# Altium footprint library Connectors.PcbLib: 268 footprints (part 14 of 21)
Each footprint in its own frame and in the unit in brackets; x right, y up, seen from the top. Pads: shape width x height; smd on the part's side, far side on the other; paste and mask are expansions set on the pad; w line width, h text height; cw(c..) or ccw(c..) is an arc to the next point about the centre after c.
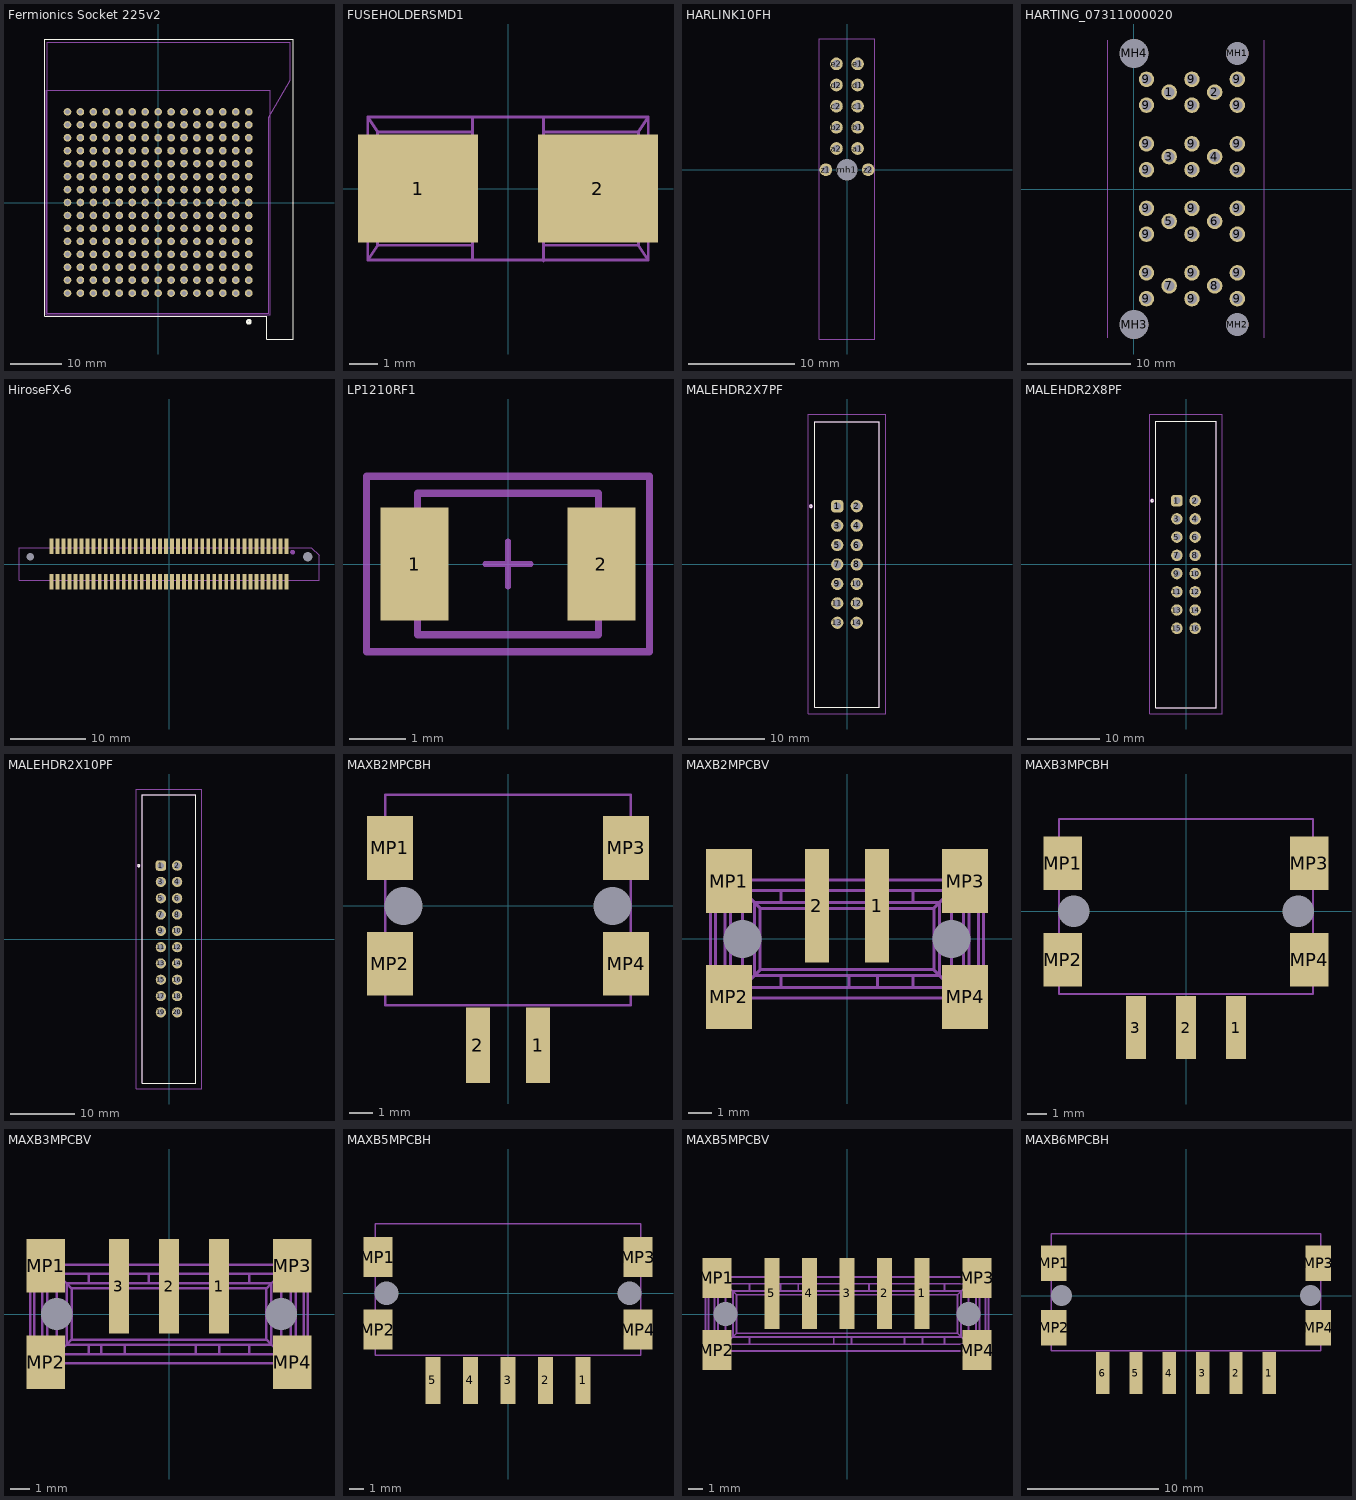
[diagram p13: the footprints below, top view; thin cyan lines are the x and y axes]

## Fermionics Socket 225v2 [mm] "Fermionics Socket 225 - Rotated Pinout to match Sensor"
height 8.636
pads (225):
  round 1.5 hole 0.9: A1(17.78,-17.78) A2(17.78,-15.24) A3(17.78,-12.7) A4(17.78,-10.16) A5(17.78,-7.62) A6(17.78,-5.08) A7(17.78,-2.54) A8(17.78,0) A9(17.78,2.54) A10(17.78,5.08) A11(17.78,7.62) A12(17.78,10.16) A13(17.78,12.7) A14(17.78,15.24) A15(17.78,17.78) B1(15.24,-17.78) B2(15.24,-15.24) B3(15.24,-12.7) B4(15.24,-10.16) B5(15.24,-7.62) B6(15.24,-5.08) B7(15.24,-2.54) B8(15.24,0) B9(15.24,2.54) B10(15.24,5.08) B11(15.24,7.62) B12(15.24,10.16) B13(15.24,12.7) B14(15.24,15.24) B15(15.24,17.78) C1(12.7,-17.78) C2(12.7,-15.24) C3(12.7,-12.7) C4(12.7,-10.16) C5(12.7,-7.62) C6(12.7,-5.08) C7(12.7,-2.54) C8(12.7,0) C9(12.7,2.54) C10(12.7,5.08) C11(12.7,7.62) C12(12.7,10.16) C13(12.7,12.7) C14(12.7,15.24) C15(12.7,17.78) D1(10.16,-17.78) D2(10.16,-15.24) D3(10.16,-12.7) D4(10.16,-10.16) D5(10.16,-7.62) D6(10.16,-5.08) D7(10.16,-2.54) D8(10.16,0) D9(10.16,2.54) D10(10.16,5.08) D11(10.16,7.62) D12(10.16,10.16) D13(10.16,12.7) D14(10.16,15.24) D15(10.16,17.78) E1(7.62,-17.78) E2(7.62,-15.24) E3(7.62,-12.7) E4(7.62,-10.16) E5(7.62,-7.62) E6(7.62,-5.08) E7(7.62,-2.54) E8(7.62,0) E9(7.62,2.54) E10(7.62,5.08) E11(7.62,7.62) E12(7.62,10.16) E13(7.62,12.7) E14(7.62,15.24) E15(7.62,17.78) F1(5.08,-17.78) F2(5.08,-15.24) F3(5.08,-12.7) F4(5.08,-10.16) F5(5.08,-7.62) F6(5.08,-5.08) F7(5.08,-2.54) F8(5.08,0) F9(5.08,2.54) F10(5.08,5.08) F11(5.08,7.62) F12(5.08,10.16) F13(5.08,12.7) F14(5.08,15.24) F15(5.08,17.78) G1(2.54,-17.78) G2(2.54,-15.24) G3(2.54,-12.7) G4(2.54,-10.16) G5(2.54,-7.62) G6(2.54,-5.08) G7(2.54,-2.54) G8(2.54,0) G9(2.54,2.54) G10(2.54,5.08) G11(2.54,7.62) G12(2.54,10.16) G13(2.54,12.7) G14(2.54,15.24) G15(2.54,17.78) H1(0,-17.78) H2(0,-15.24) H3(0,-12.7) H4(0,-10.16) H5(0,-7.62) H6(0,-5.08) H7(0,-2.54) H8(0,0) H9(0,2.54) H10(0,5.08) H11(0,7.62) H12(0,10.16) H13(0,12.7) H14(0,15.24) H15(0,17.78) J1(-2.54,-17.78) J2(-2.54,-15.24) J3(-2.54,-12.7) J4(-2.54,-10.16) J5(-2.54,-7.62) J6(-2.54,-5.08) J7(-2.54,-2.54) J8(-2.54,0) J9(-2.54,2.54) J10(-2.54,5.08) J11(-2.54,7.62) J12(-2.54,10.16) J13(-2.54,12.7) J14(-2.54,15.24) J15(-2.54,17.78) K1(-5.08,-17.78) K2(-5.08,-15.24) K3(-5.08,-12.7) K4(-5.08,-10.16) K5(-5.08,-7.62) K6(-5.08,-5.08) K7(-5.08,-2.54) K8(-5.08,0) K9(-5.08,2.54) K10(-5.08,5.08) K11(-5.08,7.62) K12(-5.08,10.16) K13(-5.08,12.7) K14(-5.08,15.24) K15(-5.08,17.78) L1(-7.62,-17.78) L2(-7.62,-15.24) L3(-7.62,-12.7) L4(-7.62,-10.16) L5(-7.62,-7.62) L6(-7.62,-5.08) L7(-7.62,-2.54) L8(-7.62,0) L9(-7.62,2.54) L10(-7.62,5.08) L11(-7.62,7.62) L12(-7.62,10.16) L13(-7.62,12.7) L14(-7.62,15.24) L15(-7.62,17.78) M1(-10.16,-17.78) M2(-10.16,-15.24) M3(-10.16,-12.7) M4(-10.16,-10.16) M5(-10.16,-7.62) M6(-10.16,-5.08) M7(-10.16,-2.54) M8(-10.16,0) M9(-10.16,2.54) M10(-10.16,5.08) M11(-10.16,7.62) M12(-10.16,10.16) M13(-10.16,12.7) M14(-10.16,15.24) M15(-10.16,17.78) N1(-12.7,-17.78) N2(-12.7,-15.24) N3(-12.7,-12.7) N4(-12.7,-10.16) N5(-12.7,-7.62) N6(-12.7,-5.08) N7(-12.7,-2.54) N8(-12.7,0) N9(-12.7,2.54) N10(-12.7,5.08) N11(-12.7,7.62) N12(-12.7,10.16) N13(-12.7,12.7) N14(-12.7,15.24) N15(-12.7,17.78) P1(-15.24,-17.78) P2(-15.24,-15.24) P3(-15.24,-12.7) P4(-15.24,-10.16) P5(-15.24,-7.62) P6(-15.24,-5.08) P7(-15.24,-2.54) P8(-15.24,0) P9(-15.24,2.54) P10(-15.24,5.08) P11(-15.24,7.62) P12(-15.24,10.16) P13(-15.24,12.7) P14(-15.24,15.24) P15(-15.24,17.78) R1(-17.78,-17.78) R2(-17.78,-15.24) R3(-17.78,-12.7) R4(-17.78,-10.16) R5(-17.78,-7.62) R6(-17.78,-5.08) R7(-17.78,-2.54) R8(-17.78,0) R9(-17.78,2.54) R10(-17.78,5.08) R11(-17.78,7.62) R12(-17.78,10.16) R13(-17.78,12.7) R14(-17.78,15.24) R15(-17.78,17.78)
Top Overlay:
  circle w0.5: c17.8,-23.4 r0.3
  lines w0.2: -22.275,-22.3 21.35,-22.3 21.35,-26.775 26.55,-26.775 26.55,32.075 -22.275,32.075 -22.275,-22.3
Mechanical 13:
  lines w0.1: -21.715,-21.715 21.715,-21.715 21.715,16.755 25.912,23.995 25.912,31.485 -21.715,31.485 -21.715,-21.715
Mechanical 15:
  lines w0.05: -21.975,-21.975 21.975,-21.975 21.975,21.975 -21.975,21.975 -21.975,-21.975
3D body: height 0, standoff -3.23, extent 17.485,-18.075 18.06,-17.5
3D body: height 0, standoff -3.23, extent 17.485,-15.535 18.06,-14.96
3D body: height 0, standoff -3.23, extent 17.485,-12.995 18.06,-12.42
3D body: height 0, standoff -3.23, extent 17.485,-10.455 18.06,-9.88
3D body: height 0, standoff -3.23, extent 17.485,-7.915 18.06,-7.34
3D body: height 0, standoff -3.23, extent 17.485,-5.375 18.06,-4.8
3D body: height 0, standoff -3.23, extent 17.485,-2.835 18.06,-2.26
3D body: height 0, standoff -3.23, extent 17.485,-0.295 18.06,0.28
3D body: height 0, standoff -3.23, extent 17.485,2.245 18.06,2.82
3D body: height 0, standoff -3.23, extent 17.485,4.785 18.06,5.36
3D body: height 0, standoff -3.23, extent 17.485,7.325 18.06,7.9
3D body: height 0, standoff -3.23, extent 17.485,9.865 18.06,10.44
3D body: height 0, standoff -3.23, extent 17.485,12.405 18.06,12.98
3D body: height 0, standoff -3.23, extent 17.485,14.945 18.06,15.52
3D body: height 0, standoff -3.23, extent 17.485,17.485 18.06,18.06
3D body: height 0, standoff -3.23, extent 14.945,-18.075 15.52,-17.5
3D body: height 0, standoff -3.23, extent 14.945,-15.535 15.52,-14.96
3D body: height 0, standoff -3.23, extent 14.945,-12.995 15.52,-12.42
3D body: height 0, standoff -3.23, extent 14.945,-10.455 15.52,-9.88
3D body: height 0, standoff -3.23, extent 14.945,-7.915 15.52,-7.34
3D body: height 0, standoff -3.23, extent 14.945,-5.375 15.52,-4.8
3D body: height 0, standoff -3.23, extent 14.945,-2.835 15.52,-2.26
3D body: height 0, standoff -3.23, extent 14.945,-0.295 15.52,0.28
3D body: height 0, standoff -3.23, extent 14.945,2.245 15.52,2.82
3D body: height 0, standoff -3.23, extent 14.945,4.785 15.52,5.36
3D body: height 0, standoff -3.23, extent 14.945,7.325 15.52,7.9
3D body: height 0, standoff -3.23, extent 14.945,9.865 15.52,10.44
3D body: height 0, standoff -3.23, extent 14.945,12.405 15.52,12.98
3D body: height 0, standoff -3.23, extent 14.945,14.945 15.52,15.52
3D body: height 0, standoff -3.23, extent 14.945,17.485 15.52,18.06
3D body: height 0, standoff -3.23, extent 12.405,-18.075 12.98,-17.5
3D body: height 0, standoff -3.23, extent 12.405,-15.535 12.98,-14.96
3D body: height 0, standoff -3.23, extent 12.405,-12.995 12.98,-12.42
3D body: height 0, standoff -3.23, extent 12.405,-10.455 12.98,-9.88
3D body: height 0, standoff -3.23, extent 12.405,-7.915 12.98,-7.34
3D body: height 0, standoff -3.23, extent 12.405,-5.375 12.98,-4.8
3D body: height 0, standoff -3.23, extent 12.405,-2.835 12.98,-2.26
3D body: height 0, standoff -3.23, extent 12.405,-0.295 12.98,0.28
3D body: height 0, standoff -3.23, extent 12.405,2.245 12.98,2.82
3D body: height 0, standoff -3.23, extent 12.405,4.785 12.98,5.36
3D body: height 0, standoff -3.23, extent 12.405,7.325 12.98,7.9
3D body: height 0, standoff -3.23, extent 12.405,9.865 12.98,10.44
3D body: height 0, standoff -3.23, extent 12.405,12.405 12.98,12.98
3D body: height 0, standoff -3.23, extent 12.405,14.945 12.98,15.52
3D body: height 0, standoff -3.23, extent 12.405,17.485 12.98,18.06
3D body: height 0, standoff -3.23, extent 9.865,-18.075 10.44,-17.5
3D body: height 0, standoff -3.23, extent 9.865,-15.535 10.44,-14.96
3D body: height 0, standoff -3.23, extent 9.865,-12.995 10.44,-12.42
3D body: height 0, standoff -3.23, extent 9.865,-10.455 10.44,-9.88
3D body: height 0, standoff -3.23, extent 9.865,-7.915 10.44,-7.34
3D body: height 0, standoff -3.23, extent 9.865,-5.375 10.44,-4.8
3D body: height 0, standoff -3.23, extent 9.865,-2.835 10.44,-2.26
3D body: height 0, standoff -3.23, extent 9.865,-0.295 10.44,0.28
3D body: height 0, standoff -3.23, extent 9.865,2.245 10.44,2.82
3D body: height 0, standoff -3.23, extent 9.865,4.785 10.44,5.36
3D body: height 0, standoff -3.23, extent 9.865,7.325 10.44,7.9
3D body: height 0, standoff -3.23, extent 9.865,9.865 10.44,10.44
3D body: height 0, standoff -3.23, extent 9.865,12.405 10.44,12.98
3D body: height 0, standoff -3.23, extent 9.865,14.945 10.44,15.52
3D body: height 0, standoff -3.23, extent 9.865,17.485 10.44,18.06
3D body: height 0, standoff -3.23, extent 7.325,-18.075 7.9,-17.5
3D body: height 0, standoff -3.23, extent 7.325,-15.535 7.9,-14.96
3D body: height 0, standoff -3.23, extent 7.325,-12.995 7.9,-12.42
3D body: height 0, standoff -3.23, extent 7.325,-10.455 7.9,-9.88
3D body: height 0, standoff -3.23, extent 7.325,-7.915 7.9,-7.34
3D body: height 0, standoff -3.23, extent 7.325,-5.375 7.9,-4.8
3D body: height 0, standoff -3.23, extent 7.325,-2.835 7.9,-2.26
3D body: height 0, standoff -3.23, extent 7.325,-0.295 7.9,0.28
3D body: height 0, standoff -3.23, extent 7.325,2.245 7.9,2.82
3D body: height 0, standoff -3.23, extent 7.325,4.785 7.9,5.36
3D body: height 0, standoff -3.23, extent 7.325,7.325 7.9,7.9
3D body: height 0, standoff -3.23, extent 7.325,9.865 7.9,10.44
3D body: height 0, standoff -3.23, extent 7.325,12.405 7.9,12.98
3D body: height 0, standoff -3.23, extent 7.325,14.945 7.9,15.52
3D body: height 0, standoff -3.23, extent 7.325,17.485 7.9,18.06
3D body: height 0, standoff -3.23, extent 4.785,-18.075 5.36,-17.5
3D body: height 0, standoff -3.23, extent 4.785,-15.535 5.36,-14.96
3D body: height 0, standoff -3.23, extent 4.785,-12.995 5.36,-12.42
3D body: height 0, standoff -3.23, extent 4.785,-10.455 5.36,-9.88
3D body: height 0, standoff -3.23, extent 4.785,-7.915 5.36,-7.34
3D body: height 0, standoff -3.23, extent 4.785,-5.375 5.36,-4.8
3D body: height 0, standoff -3.23, extent 4.785,-2.835 5.36,-2.26
3D body: height 0, standoff -3.23, extent 4.785,-0.295 5.36,0.28
3D body: height 0, standoff -3.23, extent 4.785,2.245 5.36,2.82
3D body: height 0, standoff -3.23, extent 4.785,4.785 5.36,5.36
3D body: height 0, standoff -3.23, extent 4.785,7.325 5.36,7.9
3D body: height 0, standoff -3.23, extent 4.785,9.865 5.36,10.44
3D body: height 0, standoff -3.23, extent 4.785,12.405 5.36,12.98
3D body: height 0, standoff -3.23, extent 4.785,14.945 5.36,15.52
3D body: height 0, standoff -3.23, extent 4.785,17.485 5.36,18.06
3D body: height 0, standoff -3.23, extent 2.245,-18.075 2.82,-17.5
3D body: height 0, standoff -3.23, extent 2.245,-15.535 2.82,-14.96
3D body: height 0, standoff -3.23, extent 2.245,-12.995 2.82,-12.42
3D body: height 0, standoff -3.23, extent 2.245,-10.455 2.82,-9.88
3D body: height 0, standoff -3.23, extent 2.245,-7.915 2.82,-7.34
3D body: height 0, standoff -3.23, extent 2.245,-5.375 2.82,-4.8
3D body: height 0, standoff -3.23, extent 2.245,-2.835 2.82,-2.26
3D body: height 0, standoff -3.23, extent 2.245,-0.295 2.82,0.28
3D body: height 0, standoff -3.23, extent 2.245,2.245 2.82,2.82
3D body: height 0, standoff -3.23, extent 2.245,4.785 2.82,5.36
3D body: height 0, standoff -3.23, extent 2.245,7.325 2.82,7.9
3D body: height 0, standoff -3.23, extent 2.245,9.865 2.82,10.44
3D body: height 0, standoff -3.23, extent 2.245,12.405 2.82,12.98
3D body: height 0, standoff -3.23, extent 2.245,14.945 2.82,15.52
3D body: height 0, standoff -3.23, extent 2.245,17.485 2.82,18.06
3D body: height 0, standoff -3.23, extent -0.295,-18.075 0.28,-17.5
3D body: height 0, standoff -3.23, extent -0.295,-15.535 0.28,-14.96
3D body: height 0, standoff -3.23, extent -0.295,-12.995 0.28,-12.42
3D body: height 0, standoff -3.23, extent -0.295,-10.455 0.28,-9.88
3D body: height 0, standoff -3.23, extent -0.295,-7.915 0.28,-7.34
3D body: height 0, standoff -3.23, extent -0.295,-5.375 0.28,-4.8
3D body: height 0, standoff -3.23, extent -0.295,-2.835 0.28,-2.26
3D body: height 0, standoff -3.23, extent -0.295,-0.295 0.28,0.28
3D body: height 0, standoff -3.23, extent -0.295,2.245 0.28,2.82
3D body: height 0, standoff -3.23, extent -0.295,4.785 0.28,5.36
3D body: height 0, standoff -3.23, extent -0.295,7.325 0.28,7.9
3D body: height 0, standoff -3.23, extent -0.295,9.865 0.28,10.44
3D body: height 0, standoff -3.23, extent -0.295,12.405 0.28,12.98
3D body: height 0, standoff -3.23, extent -0.295,14.945 0.28,15.52
3D body: height 0, standoff -3.23, extent -0.295,17.485 0.28,18.06
3D body: height 0, standoff -3.23, extent -2.835,-18.075 -2.26,-17.5
3D body: height 0, standoff -3.23, extent -2.835,-15.535 -2.26,-14.96
3D body: height 0, standoff -3.23, extent -2.835,-12.995 -2.26,-12.42
3D body: height 0, standoff -3.23, extent -2.835,-10.455 -2.26,-9.88
3D body: height 0, standoff -3.23, extent -2.835,-7.915 -2.26,-7.34
3D body: height 0, standoff -3.23, extent -2.835,-5.375 -2.26,-4.8
3D body: height 0, standoff -3.23, extent -2.835,-2.835 -2.26,-2.26
3D body: height 0, standoff -3.23, extent -2.835,-0.295 -2.26,0.28
3D body: height 0, standoff -3.23, extent -2.835,2.245 -2.26,2.82
3D body: height 0, standoff -3.23, extent -2.835,4.785 -2.26,5.36
3D body: height 0, standoff -3.23, extent -2.835,7.325 -2.26,7.9
3D body: height 0, standoff -3.23, extent -2.835,9.865 -2.26,10.44
3D body: height 0, standoff -3.23, extent -2.835,12.405 -2.26,12.98
3D body: height 0, standoff -3.23, extent -2.835,14.945 -2.26,15.52
3D body: height 0, standoff -3.23, extent -2.835,17.485 -2.26,18.06
3D body: height 0, standoff -3.23, extent -5.375,-18.075 -4.8,-17.5
3D body: height 0, standoff -3.23, extent -5.375,-15.535 -4.8,-14.96
3D body: height 0, standoff -3.23, extent -5.375,-12.995 -4.8,-12.42
3D body: height 0, standoff -3.23, extent -5.375,-10.455 -4.8,-9.88
3D body: height 0, standoff -3.23, extent -5.375,-7.915 -4.8,-7.34
3D body: height 0, standoff -3.23, extent -5.375,-5.375 -4.8,-4.8
3D body: height 0, standoff -3.23, extent -5.375,-2.835 -4.8,-2.26
3D body: height 0, standoff -3.23, extent -5.375,-0.295 -4.8,0.28
3D body: height 0, standoff -3.23, extent -5.375,2.245 -4.8,2.82
3D body: height 0, standoff -3.23, extent -5.375,4.785 -4.8,5.36
3D body: height 0, standoff -3.23, extent -5.375,7.325 -4.8,7.9
3D body: height 0, standoff -3.23, extent -5.375,9.865 -4.8,10.44
3D body: height 0, standoff -3.23, extent -5.375,12.405 -4.8,12.98
3D body: height 0, standoff -3.23, extent -5.375,14.945 -4.8,15.52
3D body: height 0, standoff -3.23, extent -5.375,17.485 -4.8,18.06
3D body: height 0, standoff -3.23, extent -7.915,-18.075 -7.34,-17.5
3D body: height 0, standoff -3.23, extent -7.915,-15.535 -7.34,-14.96
3D body: height 0, standoff -3.23, extent -7.915,-12.995 -7.34,-12.42
3D body: height 0, standoff -3.23, extent -7.915,-10.455 -7.34,-9.88
3D body: height 0, standoff -3.23, extent -7.915,-7.915 -7.34,-7.34
3D body: height 0, standoff -3.23, extent -7.915,-5.375 -7.34,-4.8
3D body: height 0, standoff -3.23, extent -7.915,-2.835 -7.34,-2.26
3D body: height 0, standoff -3.23, extent -7.915,-0.295 -7.34,0.28
3D body: height 0, standoff -3.23, extent -7.915,2.245 -7.34,2.82
3D body: height 0, standoff -3.23, extent -7.915,4.785 -7.34,5.36
3D body: height 0, standoff -3.23, extent -7.915,7.325 -7.34,7.9
3D body: height 0, standoff -3.23, extent -7.915,9.865 -7.34,10.44
3D body: height 0, standoff -3.23, extent -7.915,12.405 -7.34,12.98
3D body: height 0, standoff -3.23, extent -7.915,14.945 -7.34,15.52
3D body: height 0, standoff -3.23, extent -7.915,17.485 -7.34,18.06
3D body: height 0, standoff -3.23, extent -10.455,-18.075 -9.88,-17.5
3D body: height 0, standoff -3.23, extent -10.455,-15.535 -9.88,-14.96
3D body: height 0, standoff -3.23, extent -10.455,-12.995 -9.88,-12.42
3D body: height 0, standoff -3.23, extent -10.455,-10.455 -9.88,-9.88
3D body: height 0, standoff -3.23, extent -10.455,-7.915 -9.88,-7.34
3D body: height 0, standoff -3.23, extent -10.455,-5.375 -9.88,-4.8
3D body: height 0, standoff -3.23, extent -10.455,-2.835 -9.88,-2.26
3D body: height 0, standoff -3.23, extent -10.455,-0.295 -9.88,0.28
3D body: height 0, standoff -3.23, extent -10.455,2.245 -9.88,2.82
3D body: height 0, standoff -3.23, extent -10.455,4.785 -9.88,5.36
3D body: height 0, standoff -3.23, extent -10.455,7.325 -9.88,7.9
3D body: height 0, standoff -3.23, extent -10.455,9.865 -9.88,10.44
3D body: height 0, standoff -3.23, extent -10.455,12.405 -9.88,12.98
3D body: height 0, standoff -3.23, extent -10.455,14.945 -9.88,15.52
3D body: height 0, standoff -3.23, extent -10.455,17.485 -9.88,18.06
3D body: height 0, standoff -3.23, extent -12.995,-18.075 -12.42,-17.5
3D body: height 0, standoff -3.23, extent -12.995,-15.535 -12.42,-14.96
3D body: height 0, standoff -3.23, extent -12.995,-12.995 -12.42,-12.42
3D body: height 0, standoff -3.23, extent -12.995,-10.455 -12.42,-9.88
3D body: height 0, standoff -3.23, extent -12.995,-7.915 -12.42,-7.34
3D body: height 0, standoff -3.23, extent -12.995,-5.375 -12.42,-4.8
3D body: height 0, standoff -3.23, extent -12.995,-2.835 -12.42,-2.26
3D body: height 0, standoff -3.23, extent -12.995,-0.295 -12.42,0.28
3D body: height 0, standoff -3.23, extent -12.995,2.245 -12.42,2.82
3D body: height 0, standoff -3.23, extent -12.995,4.785 -12.42,5.36
3D body: height 0, standoff -3.23, extent -12.995,7.325 -12.42,7.9
3D body: height 0, standoff -3.23, extent -12.995,9.865 -12.42,10.44
3D body: height 0, standoff -3.23, extent -12.995,12.405 -12.42,12.98
3D body: height 0, standoff -3.23, extent -12.995,14.945 -12.42,15.52
3D body: height 0, standoff -3.23, extent -12.995,17.485 -12.42,18.06
3D body: height 0, standoff -3.23, extent -15.535,-18.075 -14.96,-17.5
3D body: height 0, standoff -3.23, extent -15.535,-15.535 -14.96,-14.96
3D body: height 0, standoff -3.23, extent -15.535,-12.995 -14.96,-12.42
3D body: height 0, standoff -3.23, extent -15.535,-10.455 -14.96,-9.88
3D body: height 0, standoff -3.23, extent -15.535,-7.915 -14.96,-7.34
3D body: height 0, standoff -3.23, extent -15.535,-5.375 -14.96,-4.8
3D body: height 0, standoff -3.23, extent -15.535,-2.835 -14.96,-2.26
3D body: height 0, standoff -3.23, extent -15.535,-0.295 -14.96,0.28
3D body: height 0, standoff -3.23, extent -15.535,2.245 -14.96,2.82
3D body: height 0, standoff -3.23, extent -15.535,4.785 -14.96,5.36
3D body: height 0, standoff -3.23, extent -15.535,7.325 -14.96,7.9
3D body: height 0, standoff -3.23, extent -15.535,9.865 -14.96,10.44
3D body: height 0, standoff -3.23, extent -15.535,12.405 -14.96,12.98
3D body: height 0, standoff -3.23, extent -15.535,14.945 -14.96,15.52
3D body: height 0, standoff -3.23, extent -15.535,17.485 -14.96,18.06
3D body: height 0, standoff -3.23, extent -18.075,17.485 -17.5,18.06
3D body: height 0, standoff -3.23, extent -18.075,14.945 -17.5,15.52
3D body: height 0, standoff -3.23, extent -18.075,12.405 -17.5,12.98
3D body: height 0, standoff -3.23, extent -18.075,9.865 -17.5,10.44
3D body: height 0, standoff -3.23, extent -18.075,7.325 -17.5,7.9
3D body: height 0, standoff -3.23, extent -18.075,4.785 -17.5,5.36
3D body: height 0, standoff -3.23, extent -18.075,2.245 -17.5,2.82
3D body: height 0, standoff -3.23, extent -18.075,-0.295 -17.5,0.28
3D body: height 0, standoff -3.23, extent -18.075,-2.835 -17.5,-2.26
3D body: height 0, standoff -3.23, extent -18.075,-5.375 -17.5,-4.8
3D body: height 0, standoff -3.23, extent -18.075,-7.915 -17.5,-7.34
3D body: height 0, standoff -3.23, extent -18.075,-10.455 -17.5,-9.88
3D body: height 0, standoff -3.23, extent -18.075,-12.995 -17.5,-12.42
3D body: height 0, standoff -3.23, extent -18.075,-15.535 -17.5,-14.96
3D body: height 0, standoff -3.23, extent -18.075,-18.075 -17.5,-17.5
3D body: height 8.64, standoff 0, extent -21.715,-21.715 25.912,31.485
3D body: height 8.64, standoff 4, extent 21.975,-26.795 25.726,23.675

## FUSEHOLDERSMD1 [mm]
pads (2):
  rect 4.24x3.81 smd: 1(-3.175,0) 2(3.175,0)
Mechanical 13:
  lines w0.102: -1.25,-2.525 -1.25,-1.325 -3.5,-1.325 -3.5,1.325 -1.25,1.325 -1.25,2.525 ; -1.25,-2 -4.6,-2 ; -1.25,2 -4.6,2 ; 1.25,-2.55 1.25,-1.35 3.5,-1.35 3.5,1.3 1.25,1.3 1.25,2.5 ; 1.25,-2 4.6,-2 ; 1.25,2 4.6,2 ; -4.95,-2.525 -4.95,2.525 ; -4.95,-2.525 4.95,-2.525 ; -4.95,-2.525 -4.6,-2 ; -4.95,2.525 4.95,2.525 ; -4.95,2.525 -4.6,2 ; -4.6,-2 -4.6,2 ; 4.6,-2 4.6,2 ; 4.6,-2 4.95,-2.525 ; 4.6,2 4.95,2.525 ; 4.95,-2.525 4.95,2.525

## HARLINK10FH [mm] "HarLink 10pin female hor."
height 11.5
pads (13):
  round 1.2 hole 0.7: a1(1,2) a2(-1,2) b1(1,4) b2(-1,4) c1(1,6) c2(-1,6) d1(1,8) d2(-1,8) e1(1,10) e2(-1,10) z1(-2,0) z2(2,0)
  round 1.9 hole 2 unplated mask+0.2: mh1(0,0)
Mechanical 13:
  lines w0.1: -2.6,-16 -2.6,12.35 2.6,12.35 2.6,-16 -2.6,-16
3D body "27_har-link_female_angled_PCB.stp": height 11.75, standoff -3, extent -2.899,-16 2.899,12.35

## HARTING_07311000020 [mm] "Coax conn 8ch Harting 0731 100 0020"
height 7.925
pads (36):
  round 1.5 hole 1: 1(3.45,9.375) 2(7.85,9.375) 3(3.45,3.125) 4(7.85,3.125) 5(3.45,-3.125) 6(7.85,-3.125) 7(3.45,-9.375) 8(7.85,-9.375) 9(1.25,-10.625) 9(1.25,-8.125) 9(1.25,-4.375) 9(1.25,-1.875) 9(1.25,1.875) 9(1.25,4.375) 9(1.25,8.125) 9(1.25,10.625) 9(5.65,-10.625) 9(5.65,-8.125) 9(5.65,-4.375) 9(5.65,-1.875) 9(5.65,1.875) 9(5.65,4.375) 9(5.65,8.125) 9(5.65,10.625) 9(10.05,-10.625) 9(10.05,-8.125) 9(10.05,-4.375) 9(10.05,-1.875) 9(10.05,1.875) 9(10.05,4.375) 9(10.05,8.125) 9(10.05,10.625)
  round 2.15 hole 2.2 unplated: MH1(10.05,13.125) MH2(10.05,-13.125)
  round 2.75 hole 2.8 unplated: MH3(0.05,-13.125) MH4(0.05,13.125)
Mechanical 15:
  lines w0.1: -2.5,-14.4 -2.5,14.4 ; 12.65,-14.4 12.65,14.4
  text "NO COMPONENTS HERE" at 12.35,8.8 h1
3D body "0731_Mini_Coax_angled_8-pak.stp": height 9, standoff -4, extent -14.85,-14.55 11.7,14.6

## HiroseFX-6 [mm] "0.8mm Pitch Stacking Height 9mm Header-Stacking Connector"
height 7
pads (82):
  rect 0.5x2 smd: 1(15.6,2.35) 2(15.6,-2.35) 3(14.8,2.35) 4(14.8,-2.35) 5(14,2.35) 6(14,-2.35) 7(13.2,2.35) 8(13.2,-2.35) 9(12.4,2.35) 10(12.4,-2.35) 11(11.6,2.35) 12(11.6,-2.35) 13(10.8,2.35) 14(10.8,-2.35) 15(10,2.35) 16(10,-2.35) 17(9.2,2.35) 18(9.2,-2.35) 19(8.4,2.35) 20(8.4,-2.35) 21(7.6,2.35) 22(7.6,-2.35) 23(6.8,2.35) 24(6.8,-2.35) 25(6,2.35) 26(6,-2.35) 27(5.2,2.35) 28(5.2,-2.35) 29(4.4,2.35) 30(4.4,-2.35) 31(3.6,2.35) 32(3.6,-2.35) 33(2.8,2.35) 34(2.8,-2.35) 35(2,2.35) 36(2,-2.35) 37(1.2,2.35) 38(1.2,-2.35) 39(0.4,2.35) 40(0.4,-2.35) 41(-0.4,2.35) 42(-0.4,-2.35) 43(-1.2,2.35) 44(-1.2,-2.35) 45(-2,2.35) 46(-2,-2.35) 47(-2.8,2.35) 48(-2.8,-2.35) 49(-3.6,2.35) 50(-3.6,-2.35) 51(-4.4,2.35) 52(-4.4,-2.35) 53(-5.2,2.35) 54(-5.2,-2.35) 55(-6,2.35) 56(-6,-2.35) 57(-6.8,2.35) 58(-6.8,-2.35) 59(-7.6,2.35) 60(-7.6,-2.35) 61(-8.4,2.35) 62(-8.4,-2.35) 63(-9.2,2.35) 64(-9.2,-2.35) 65(-10,2.35) 66(-10,-2.35) 67(-10.8,2.35) 68(-10.8,-2.35) 69(-11.6,2.35) 70(-11.6,-2.35) 71(-12.4,2.35) 72(-12.4,-2.35) 73(-13.2,2.35) 74(-13.2,-2.35) 75(-14,2.35) 76(-14,-2.35) 77(-14.8,2.35) 78(-14.8,-2.35) 79(-15.6,2.35) 80(-15.6,-2.35)
  round 0 hole 1.3 unplated: MH1(18.4,0.95)
  round 0 hole 1 unplated: MH2(-18.4,0.95)
Mechanical 13:
  circle w0.381: c16.4,1.575 r0.125
  lines w0.127: -19.9,-2.15 -19.9,2.15 18.9,2.15 19.9,1.15 19.9,-2.15 -19.9,-2.15
3D body: height 0, standoff -0.8, extent -18.85,0.5 -17.95,1.4
3D body: height 0, standoff -0.8, extent 17.8,0.35 19,1.55
3D body: height 4, standoff 0, extent -19.9,-2.15 19.9,2.15
3D body: height 4.01, standoff 4, extent 16.1,1.275 16.7,1.875

## LP1210RF1 [mm] "Chip capacitor 1210 (3225)"
height 2
pads (2):
  rect 1.2x2 smd: 1(-1.65,0) 2(1.65,0)
Mechanical 13:
  lines w0.127: -1.6,-1.25 1.6,-1.25 1.6,1.25 -1.6,1.25 -1.6,-1.25
Mechanical 15:
  lines w0.102: -0.4,0 0.4,0 ; 0,-0.4 0,0.4
  lines w0.127: -2.5,-1.55 -2.5,1.55 2.5,1.55 2.5,-1.55 -2.5,-1.55
3D body: height 2, standoff 0, extent -1.6,-1.25 1.6,1.25

## MALEHDR2X7PF [mm] "Male header 2x7 pin R2.54mm press fit"
height 24.7
pads (14):
  rrect50% 1.6x1.6 hole 1 paste-1.27: 1(-1.27,7.62)
  round 1.6 hole 1 paste-1.27: 2(1.27,7.62) 3(-1.27,5.08) 4(1.27,5.08) 5(-1.27,2.54) 6(1.27,2.54) 7(-1.27,0) 8(1.27,0) 9(-1.27,-2.54) 10(1.27,-2.54) 11(-1.27,-5.08) 12(1.27,-5.08) 13(-1.27,-7.62) 14(1.27,-7.62)
Top Overlay:
  circle w0.15: c-4.724,7.62 r0.152
  lines w0.127: -4.191,-18.669 -4.191,18.669 4.191,18.669 4.191,-18.669 -4.191,-18.669
Mechanical 13:
  circle w0.254: c-4.724,7.62 r0.152
  lines w0.102: -4.2,-18.66 4.2,-18.66 4.2,18.66 -4.2,18.66 -4.2,-18.66
Mechanical 15:
  lines w0.127: -5.08,-19.558 5.08,-19.558 5.08,19.685 -5.08,19.685 -5.08,-19.558
3D body: height 6, standoff 0, extent -4.2,-18.66 4.2,18.66
3D body: height 24.7, standoff 13.2, extent -1.524,11.548 1.524,18.66
3D body: height 24.7, standoff 13.2, extent -1.524,-18.66 1.524,-11.548
3D body: height 13.2, standoff 6, extent 0,-18.66 4.2,18.66
3D body: height 13.2, standoff 6, extent -4.2,2.54 0,18.66
3D body: height 13.2, standoff 6, extent -4.2,-18.66 0,-2.565
3D body: height 13.2, standoff 6, extent -1.651,7.239 -0.889,8.001
3D body: height 13.2, standoff 6, extent -1.651,4.699 -0.889,5.461
3D body: height 13.2, standoff 6, extent -1.651,2.159 -0.889,2.921
3D body: height 13.2, standoff 6, extent -1.651,-0.381 -0.889,0.381
3D body: height 13.2, standoff 6, extent -1.651,-2.921 -0.889,-2.159
3D body: height 13.2, standoff 6, extent -1.651,-5.461 -0.889,-4.699
3D body: height 13.2, standoff 6, extent -1.651,-8.001 -0.889,-7.239
3D body: height 0, standoff -4.6, extent -1.524,7.112 -1.016,8.128
3D body: height 0, standoff -4.6, extent -1.524,4.572 -1.016,5.588
3D body: height 0, standoff -4.6, extent -1.524,2.032 -1.016,3.048
3D body: height 0, standoff -4.6, extent -1.524,-0.508 -1.016,0.508
3D body: height 0, standoff -4.6, extent -1.524,-3.048 -1.016,-2.032
3D body: height 0, standoff -4.6, extent -1.524,-5.588 -1.016,-4.572
3D body: height 0, standoff -4.6, extent -1.524,-8.128 -1.016,-7.112
3D body: height 0, standoff -4.6, extent 1.016,-8.128 1.524,-7.112
3D body: height 0, standoff -4.6, extent 1.016,-5.588 1.524,-4.572
3D body: height 0, standoff -4.6, extent 1.016,-3.048 1.524,-2.032
3D body: height 0, standoff -4.6, extent 1.016,-0.508 1.524,0.508
3D body: height 0, standoff -4.6, extent 1.016,2.032 1.524,3.048
3D body: height 0, standoff -4.6, extent 1.016,4.572 1.524,5.588
3D body: height 0, standoff -4.6, extent 1.016,7.112 1.524,8.128
3D body: height 13.2, standoff 6, extent 0.889,-8.001 1.651,-7.239
3D body: height 13.2, standoff 6, extent 0.889,-5.461 1.651,-4.699
3D body: height 13.2, standoff 6, extent 0.889,-2.921 1.651,-2.159
3D body: height 13.2, standoff 6, extent 0.889,-0.381 1.651,0.381
3D body: height 13.2, standoff 6, extent 0.889,2.159 1.651,2.921
3D body: height 13.2, standoff 6, extent 0.889,4.699 1.651,5.461
3D body: height 13.2, standoff 6, extent 0.889,7.239 1.651,8.001

## MALEHDR2X8PF [mm] "Male header 2x8 pin R2.54mm press fit"
height 24.7
pads (16):
  rrect50% 1.6x1.6 hole 1 paste-1.27: 1(-1.27,8.89)
  round 1.6 hole 1 paste-1.27: 2(1.27,8.89) 3(-1.27,6.35) 4(1.27,6.35) 5(-1.27,3.81) 6(1.27,3.81) 7(-1.27,1.27) 8(1.27,1.27) 9(-1.27,-1.27) 10(1.27,-1.27) 11(-1.27,-3.81) 12(1.27,-3.81) 13(-1.27,-6.35) 14(1.27,-6.35) 15(-1.27,-8.89) 16(1.27,-8.89)
Top Overlay:
  circle w0.15: c-4.724,8.89 r0.152
  lines w0.127: -4.191,-19.939 -4.191,19.939 4.191,19.939 4.191,-19.939 -4.191,-19.939
Mechanical 13:
  circle w0.254: c-4.724,8.89 r0.152
  lines w0.102: -4.2,-19.93 4.2,-19.93 4.2,19.93 -4.2,19.93 -4.2,-19.93
Mechanical 15:
  lines w0.127: -5.08,-20.828 5.08,-20.828 5.08,20.955 -5.08,20.955 -5.08,-20.828
3D body: height 6, standoff 0, extent -4.2,-19.93 4.2,19.93
3D body: height 24.7, standoff 13.2, extent -1.524,12.818 1.524,19.93
3D body: height 24.7, standoff 13.2, extent -1.524,-19.93 1.524,-12.818
3D body: height 13.2, standoff 6, extent 0,-19.93 4.2,19.93
3D body: height 13.2, standoff 6, extent -4.2,2.54 0,19.93
3D body: height 13.2, standoff 6, extent -4.2,-19.93 0,-2.54
3D body: height 13.2, standoff 6, extent -1.651,8.509 -0.889,9.271
3D body: height 13.2, standoff 6, extent -1.651,5.969 -0.889,6.731
3D body: height 13.2, standoff 6, extent -1.651,3.429 -0.889,4.191
3D body: height 13.2, standoff 6, extent -1.651,0.889 -0.889,1.651
3D body: height 13.2, standoff 6, extent -1.651,-1.651 -0.889,-0.889
3D body: height 13.2, standoff 6, extent -1.651,-4.191 -0.889,-3.429
3D body: height 13.2, standoff 6, extent -1.651,-6.731 -0.889,-5.969
3D body: height 13.2, standoff 6, extent -1.651,-9.271 -0.889,-8.509
3D body: height 0, standoff -4.6, extent -1.524,8.382 -1.016,9.398
3D body: height 0, standoff -4.6, extent -1.524,5.842 -1.016,6.858
3D body: height 0, standoff -4.6, extent -1.524,3.302 -1.016,4.318
3D body: height 0, standoff -4.6, extent -1.524,0.762 -1.016,1.778
3D body: height 0, standoff -4.6, extent -1.524,-1.778 -1.016,-0.762
3D body: height 0, standoff -4.6, extent -1.524,-4.318 -1.016,-3.302
3D body: height 0, standoff -4.6, extent -1.524,-6.858 -1.016,-5.842
3D body: height 0, standoff -4.6, extent -1.524,-9.398 -1.016,-8.382
3D body: height 0, standoff -4.6, extent 1.016,-9.398 1.524,-8.382
3D body: height 0, standoff -4.6, extent 1.016,-6.858 1.524,-5.842
3D body: height 0, standoff -4.6, extent 1.016,-4.318 1.524,-3.302
3D body: height 0, standoff -4.6, extent 1.016,-1.778 1.524,-0.762
3D body: height 0, standoff -4.6, extent 1.016,0.762 1.524,1.778
3D body: height 0, standoff -4.6, extent 1.016,3.302 1.524,4.318
3D body: height 0, standoff -4.6, extent 1.016,5.842 1.524,6.858
3D body: height 0, standoff -4.6, extent 1.016,8.382 1.524,9.398
3D body: height 13.2, standoff 6, extent 0.889,-9.271 1.651,-8.509
3D body: height 13.2, standoff 6, extent 0.889,-6.731 1.651,-5.969
3D body: height 13.2, standoff 6, extent 0.889,-4.191 1.651,-3.429
3D body: height 13.2, standoff 6, extent 0.889,-1.651 1.651,-0.889
3D body: height 13.2, standoff 6, extent 0.889,0.889 1.651,1.651
3D body: height 13.2, standoff 6, extent 0.889,3.429 1.651,4.191
3D body: height 13.2, standoff 6, extent 0.889,5.969 1.651,6.731
3D body: height 13.2, standoff 6, extent 0.889,8.509 1.651,9.271

## MALEHDR2X10PF [mm] "Male header 2x10 pin R2.54mm press fit"
height 24.7
pads (20):
  rrect50% 1.6x1.6 hole 1 paste-1.27: 1(-1.27,11.43)
  round 1.6 hole 1 paste-1.27: 2(1.27,11.43) 3(-1.27,8.89) 4(1.27,8.89) 5(-1.27,6.35) 6(1.27,6.35) 7(-1.27,3.81) 8(1.27,3.81) 9(-1.27,1.27) 10(1.27,1.27) 11(-1.27,-1.27) 12(1.27,-1.27) 13(-1.27,-3.81) 14(1.27,-3.81) 15(-1.27,-6.35) 16(1.27,-6.35) 17(-1.27,-8.89) 18(1.27,-8.89) 19(-1.27,-11.43) 20(1.27,-11.43)
Top Overlay:
  circle w0.15: c-4.724,11.43 r0.152
  lines w0.127: -4.191,-22.479 -4.191,22.479 4.191,22.479 4.191,-22.479 -4.191,-22.479
Mechanical 13:
  circle w0.254: c-4.724,11.43 r0.152
  lines w0.102: -4.2,-22.47 4.2,-22.47 4.2,22.47 -4.2,22.47 -4.2,-22.47
Mechanical 15:
  lines w0.127: -5.08,-23.368 5.08,-23.368 5.08,23.368 -5.08,23.368 -5.08,-23.368
3D body: height 6, standoff 0, extent -4.2,-22.47 4.2,22.47
3D body: height 24.7, standoff 13.2, extent -1.524,15.24 1.524,22.352
3D body: height 24.7, standoff 13.2, extent -1.524,-22.352 1.524,-15.24
3D body: height 13.2, standoff 6, extent 0,-22.47 4.2,22.47
3D body: height 13.2, standoff 6, extent -4.2,2.54 0,22.47
3D body: height 13.2, standoff 6, extent -4.2,-22.47 0,-2.54
3D body: height 13.2, standoff 6, extent -1.651,11.049 -0.889,11.811
3D body: height 13.2, standoff 6, extent -1.651,8.509 -0.889,9.271
3D body: height 13.2, standoff 6, extent -1.651,5.969 -0.889,6.731
3D body: height 13.2, standoff 6, extent -1.651,3.429 -0.889,4.191
3D body: height 13.2, standoff 6, extent -1.651,0.889 -0.889,1.651
3D body: height 13.2, standoff 6, extent -1.651,-1.651 -0.889,-0.889
3D body: height 13.2, standoff 6, extent -1.651,-4.191 -0.889,-3.429
3D body: height 13.2, standoff 6, extent -1.651,-6.731 -0.889,-5.969
3D body: height 13.2, standoff 6, extent -1.651,-9.271 -0.889,-8.509
3D body: height 13.2, standoff 6, extent -1.651,-11.811 -0.889,-11.049
3D body: height 0, standoff -4.6, extent -1.524,10.922 -1.016,11.938
3D body: height 0, standoff -4.6, extent -1.524,8.382 -1.016,9.398
3D body: height 0, standoff -4.6, extent -1.524,5.842 -1.016,6.858
3D body: height 0, standoff -4.6, extent -1.524,3.302 -1.016,4.318
3D body: height 0, standoff -4.6, extent -1.524,0.762 -1.016,1.778
3D body: height 0, standoff -4.6, extent -1.524,-1.778 -1.016,-0.762
3D body: height 0, standoff -4.6, extent -1.524,-4.318 -1.016,-3.302
3D body: height 0, standoff -4.6, extent -1.524,-6.858 -1.016,-5.842
3D body: height 0, standoff -4.6, extent -1.524,-9.398 -1.016,-8.382
3D body: height 0, standoff -4.6, extent -1.524,-11.938 -1.016,-10.922
3D body: height 0, standoff -4.6, extent 1.016,-11.938 1.524,-10.922
3D body: height 0, standoff -4.6, extent 1.016,-9.398 1.524,-8.382
3D body: height 0, standoff -4.6, extent 1.016,-6.858 1.524,-5.842
3D body: height 0, standoff -4.6, extent 1.016,-4.318 1.524,-3.302
3D body: height 0, standoff -4.6, extent 1.016,-1.778 1.524,-0.762
3D body: height 0, standoff -4.6, extent 1.016,0.762 1.524,1.778
3D body: height 0, standoff -4.6, extent 1.016,3.302 1.524,4.318
3D body: height 0, standoff -4.6, extent 1.016,5.842 1.524,6.858
3D body: height 0, standoff -4.6, extent 1.016,8.382 1.524,9.398
3D body: height 0, standoff -4.6, extent 1.016,10.922 1.524,11.938
3D body: height 13.2, standoff 6, extent 0.889,-11.811 1.651,-11.049
3D body: height 13.2, standoff 6, extent 0.889,-9.271 1.651,-8.509
3D body: height 13.2, standoff 6, extent 0.889,-6.731 1.651,-5.969
3D body: height 13.2, standoff 6, extent 0.889,-4.191 1.651,-3.429
3D body: height 13.2, standoff 6, extent 0.889,-1.651 1.651,-0.889
3D body: height 13.2, standoff 6, extent 0.889,0.889 1.651,1.651
3D body: height 13.2, standoff 6, extent 0.889,3.429 1.651,4.191
3D body: height 13.2, standoff 6, extent 0.889,5.969 1.651,6.731
3D body: height 13.2, standoff 6, extent 0.889,8.509 1.651,9.271
3D body: height 13.2, standoff 6, extent 0.889,11.049 1.651,11.811

## MAXB2MPCBH [mm] "MaxiBridge 2 pin MALE HORIZONTAL"
height 5.05
pads (8):
  rect 1.02x3.2 smd: 1(1.27,-5.9) 2(-1.27,-5.9)
  rect 0x0 hole 1.6 unplated: MH1(-4.42,0) MH2(4.42,0)
  rect 1.95x2.7 smd: MP1(-4.995,2.45) MP2(-4.995,-2.45) MP3(4.995,2.45) MP4(4.995,-2.45)
Mechanical 13:
  lines w0.102: -5.19,-4.2 -5.19,4.7 5.19,4.7 5.19,-4.2 -5.19,-4.2
3D body "234832.STEP": height 5.07, standoff -0.73, extent -5.77,-7.5 5.77,4.7

## MAXB2MPCBV [mm] "MaxiBridge 2 pin Male vertical"
height 9.4
pads (8):
  rect 1.02x4.8 smd: 1(1.27,1.4) 2(-1.27,1.4)
  rect 0x0 hole 1.6 unplated: MH1(-4.42,0) MH2(4.42,0)
  rect 1.95x2.7 smd: MP1(-4.995,2.45) MP2(-4.995,-2.45) MP3(4.995,2.45) MP4(4.995,-2.45)
Mechanical 13:
  lines w0.127: -5.57,-1.6 -5.77,-1.485 -5.77,-1.45 -5.77,1.45 -5.77,1.485 -5.57,1.6 ; -5.22,-2.1 -5.17,-2.109 ; -5.22,2.1 -5.17,2.109 ; -5.17,-2.391 -5.22,-2.4 -5.67,-2.4 ccw(c-5.67,-2.5) -5.77,-2.5 -5.77,-3.5 ccw(c-5.67,-3.5) -5.67,-3.6 -4.32,-3.6 ccw(c-4.32,-3.5) -4.22,-3.5 -4.22,-2.5 ; -5.17,-2.1 -5.57,-2.1 -5.57,-2 -5.57,2 -5.57,2.1 -5.17,2.1 ; -5.17,2.391 -5.22,2.4 -5.67,2.4 cw(c-5.67,2.5) -5.77,2.5 -5.77,3.5 cw(c-5.67,3.5) -5.67,3.6 -4.32,3.6 cw(c-4.32,3.5) -4.22,3.5 -4.22,2.5 ; -3.51,-1.55 0.09,-1.55 ; -1.58,2.5 -1.58,3.6 -0.96,3.6 -0.96,2.5 ; 0.09,-2.05 0.09,-1.55 ; 0.96,2.5 0.96,3.6 1.58,3.6 1.58,2.5 ; 1.29,-2.05 1.29,-1.55 ; 4.22,-2.5 4.22,-3.5 ccw(c4.32,-3.5) 4.32,-3.6 5.67,-3.6 ccw(c5.67,-3.5) 5.77,-3.5 5.77,-2.5 ccw(c5.67,-2.5) 5.67,-2.4 5.22,-2.4 5.17,-2.391 ; 4.22,2.5 4.22,3.5 cw(c4.32,3.5) 4.32,3.6 5.67,3.6 cw(c5.67,3.5) 5.77,3.5 5.77,2.5 cw(c5.67,2.5) 5.67,2.4 5.22,2.4 5.17,2.391 ; 5.17,-2.109 5.22,-2.1 ; 5.17,-2.1 5.57,-2.1 5.57,-2 5.57,2 5.57,2.1 5.17,2.1 ; 5.17,2.109 5.22,2.1 ; 5.57,-1.6 5.77,-1.485 5.77,-1.45 5.77,1.45 5.77,1.485 5.57,1.6 ; -4.92,-2.5 -4.92,2.5 ; -4.92,-2.5 4.92,-2.5 ; -4.92,-2.5 -5.17,-2.5 -5.17,2.5 -4.92,2.5 ; -4.92,2.5 4.92,2.5 ; -4.42,-2.05 -2.8,-2.05 -2.8,-1.55 -3.92,-1.55 ; -4.42,-2.05 2.8,-2.05 ; -4.42,-2.05 -4.42,2.05 ; -4.42,-2.05 -3.92,-1.55 ; -4.42,2.05 -2.8,2.05 ; -4.42,2.05 -3.92,1.55 ; -3.92,-1.55 -3.92,1.55 ; -3.92,-1.55 -3.67,-1.3 ; -3.92,1.55 -2.8,1.55 ; -3.92,1.55 -3.67,1.3 ; -3.67,-1.3 -3.67,1.3 ; -3.67,-1.3 3.67,-1.3 ; -3.67,1.3 3.67,1.3 ; -2.8,1.55 -2.8,2.05 ; -2.8,1.55 2.8,1.55 ; -2.8,2.05 2.8,2.05 ; 0.09,-1.55 1.29,-1.55 ; 1.29,-1.55 2.8,-1.55 ; 2.8,-2.05 4.42,-2.05 ; 2.8,-2.05 2.8,-1.55 ; 2.8,-1.55 3.92,-1.55 ; 2.8,1.55 3.92,1.55 ; 2.8,1.55 2.8,2.05 ; 2.8,2.05 4.42,2.05 ; 3.67,-1.3 3.67,1.3 ; 3.67,-1.3 3.92,-1.55 ; 3.67,1.3 3.92,1.55 ; 3.92,-1.55 3.92,1.55 ; 3.92,-1.55 4.42,-2.05 ; 3.92,1.55 4.42,2.05 ; 4.42,-2.05 4.42,2.05 ; 4.92,-2.5 4.92,2.5 ; 4.92,-2.5 5.17,-2.5 5.17,2.5 4.92,2.5 ; -1.58,-0.76 -1.58,1.16 -0.96,1.16 -0.96,-0.76 -1.58,-0.76 ; 0.96,-0.76 0.96,1.16 1.58,1.16 1.58,-0.76 0.96,-0.76
3D body "294645.STEP": height 9.42, standoff -0.73, extent -5.77,-3.6 5.77,3.6

## MAXB3MPCBH [mm] "MaxiBridge 3 pin MALE HORIZONTAL"
height 5.05
pads (9):
  rect 1.02x3.2 smd: 1(2.54,-5.9) 2(0,-5.9) 3(-2.54,-5.9)
  rect 0x0 hole 1.6 unplated: MH1(-5.69,0) MH2(5.69,0)
  rect 1.95x2.7 smd: MP1(-6.265,2.45) MP2(-6.265,-2.45) MP3(6.265,2.45) MP4(6.265,-2.45)
Mechanical 13:
  lines w0.102: -6.46,-4.2 -6.46,4.7 6.46,4.7 6.46,-4.2 -6.451,-4.2
3D body "284052.STEP": height 5.07, standoff -0.73, extent -7.04,-7.5 7.04,4.7

## MAXB3MPCBV [mm] "MaxiBridge 3 pin Male vertical"
height 9.4
pads (9):
  rect 1.02x4.8 smd: 1(2.54,1.4) 2(0,1.4) 3(-2.54,1.4)
  rect 0x0 hole 1.6 unplated: MH1(-5.69,0) MH2(5.69,0)
  rect 1.95x2.7 smd: MP1(-6.265,2.45) MP2(-6.265,-2.45) MP3(6.265,2.45) MP4(6.265,-2.45)
Mechanical 13:
  lines w0.127: -6.84,-1.6 -7.04,-1.485 -7.04,-1.45 -7.04,1.45 -7.04,1.485 -6.84,1.6 ; -6.49,-2.1 -6.44,-2.109 ; -6.49,2.1 -6.44,2.109 ; -6.44,-2.391 -6.49,-2.4 -6.94,-2.4 ccw(c-6.94,-2.5) -7.04,-2.5 -7.04,-3.5 ccw(c-6.94,-3.5) -6.94,-3.6 -5.59,-3.6 ccw(c-5.59,-3.5) -5.49,-3.5 -5.49,-2.5 ; -6.44,-2.1 -6.84,-2.1 -6.84,-2 -6.84,2 -6.84,2.1 -6.44,2.1 ; -6.44,2.391 -6.49,2.4 -6.94,2.4 cw(c-6.94,2.5) -7.04,2.5 -7.04,3.5 cw(c-6.94,3.5) -6.94,3.6 -5.59,3.6 cw(c-5.59,3.5) -5.49,3.5 -5.49,2.5 ; -5.715,2.05 4.07,2.05 ; -3.44,-2.05 -3.44,-1.55 ; -2.85,2.5 -2.85,3.6 -2.23,3.6 -2.23,2.5 ; -2.24,-2.05 -2.24,-1.55 ; -2.24,2.05 -2.24,1.55 ; -1.04,2.05 -1.04,1.55 ; -0.31,2.5 -0.31,3.6 0.31,3.6 0.31,2.5 ; 1.36,-2.05 1.36,-1.55 ; 2.23,2.5 2.23,3.6 2.85,3.6 2.85,2.5 ; 2.56,-2.05 2.56,-1.55 ; 5.49,-2.5 5.49,-3.5 ccw(c5.59,-3.5) 5.59,-3.6 6.94,-3.6 ccw(c6.94,-3.5) 7.04,-3.5 7.04,-2.5 ccw(c6.94,-2.5) 6.94,-2.4 6.49,-2.4 6.44,-2.391 ; 5.49,2.5 5.49,3.5 cw(c5.59,3.5) 5.59,3.6 6.94,3.6 cw(c6.94,3.5) 7.04,3.5 7.04,2.5 cw(c6.94,2.5) 6.94,2.4 6.49,2.4 6.44,2.391 ; 6.44,-2.109 6.49,-2.1 ; 6.44,-2.1 6.84,-2.1 6.84,-2 6.84,2 6.84,2.1 6.44,2.1 ; 6.44,2.109 6.49,2.1 ; 6.84,-1.6 7.04,-1.485 7.04,-1.45 7.04,1.45 7.04,1.485 6.84,1.6 ; -6.19,-2.5 -6.44,-2.5 -6.44,2.5 -6.19,2.5 ; -6.19,-2.5 6.19,-2.5 ; -6.19,-2.5 -6.19,2.5 ; -6.19,2.5 6.19,2.5 ; -5.69,-2.05 -5.19,-1.55 ; -5.69,-2.05 -5.69,2.05 ; -5.69,-2.05 4.07,-2.05 ; -5.69,-2.05 -4.07,-2.05 -4.07,-1.55 ; -5.69,2.05 -5.19,1.55 ; -5.69,2.05 -4.07,2.05 -4.07,1.55 ; -5.19,-1.55 -4.94,-1.3 ; -5.19,-1.55 -4.07,-1.55 ; -5.19,-1.55 -5.19,1.55 ; -5.19,1.55 -4.94,1.3 ; -5.19,1.55 -4.07,1.55 ; -4.94,-1.3 4.94,-1.3 ; -4.94,-1.3 -4.94,1.3 ; -4.94,1.3 4.94,1.3 ; -4.07,-1.55 -3.44,-1.55 ; -4.07,1.55 -2.24,1.55 ; -3.44,-1.55 -2.24,-1.55 ; -2.24,-1.55 1.36,-1.55 ; -2.24,1.55 -1.04,1.55 ; -1.04,1.55 4.07,1.55 ; 1.36,-1.55 2.56,-1.55 ; 2.56,-1.55 4.07,-1.55 ; 4.07,-2.05 4.07,-1.55 ; 4.07,-2.05 5.69,-2.05 ; 4.07,-1.55 5.19,-1.55 ; 4.07,1.55 4.07,2.05 ; 4.07,1.55 5.19,1.55 ; 4.07,2.05 5.69,2.05 ; 4.94,-1.3 5.19,-1.55 ; 4.94,-1.3 4.94,1.3 ; 4.94,1.3 5.19,1.55 ; 5.19,-1.55 5.69,-2.05 ; 5.19,-1.55 5.19,1.55 ; 5.19,1.55 5.69,2.05 ; 5.69,-2.05 5.69,2.05 ; 6.19,-2.5 6.44,-2.5 6.44,2.5 6.19,2.5 ; 6.19,-2.5 6.19,2.5 ; -2.85,-0.76 -2.85,1.16 -2.23,1.16 -2.23,-0.76 -2.85,-0.76 ; -0.31,-0.76 0.31,-0.76 0.31,1.16 -0.31,1.16 -0.31,-0.76 ; 2.23,-0.76 2.85,-0.76 2.85,1.16 2.23,1.16 2.23,-0.76
3D body "284656.STEP": height 9.42, standoff -0.73, extent -7.04,-3.6 7.04,3.6

## MAXB5MPCBH [mm] "MaxiBridge 5 pin MALE HORIZONTAL"
height 5.05
pads (11):
  rect 1.02x3.2 smd: 1(5.08,-5.9) 2(2.54,-5.9) 3(0,-5.9) 4(-2.54,-5.9) 5(-5.08,-5.9)
  rect 0x0 hole 1.6 unplated: MH1(-8.23,0) MH2(8.23,0)
  rect 1.95x2.7 smd: MP1(-8.805,2.45) MP2(-8.805,-2.45) MP3(8.805,2.45) MP4(8.805,-2.45)
Mechanical 13:
  lines w0.102: -9,-4.2 9,-4.2 9,4.7 -9,4.7 -9,-4.2
3D body "254823.STEP": height 5.07, standoff -0.73, extent -9.58,-7.5 9.58,4.7

## MAXB5MPCBV [mm] "MaxiBridge 5 pin Male vertical"
height 9.4
pads (11):
  rect 1.02x4.8 smd: 1(5.08,1.4) 2(2.54,1.4) 3(0,1.4) 4(-2.54,1.4) 5(-5.08,1.4)
  rect 0x0 hole 1.6 unplated: MH1(-8.23,0) MH2(8.23,0)
  rect 1.95x2.7 smd: MP1(-8.805,2.45) MP2(-8.805,-2.45) MP3(8.805,2.45) MP4(8.805,-2.45)
Mechanical 13:
  lines w0.127: -9.38,-1.6 -9.58,-1.485 -9.58,-1.45 -9.58,1.45 -9.58,1.485 -9.38,1.6 ; -9.03,-2.1 -8.98,-2.109 ; -9.03,2.1 -8.98,2.109 ; -8.98,-2.391 -9.03,-2.4 -9.48,-2.4 ccw(c-9.48,-2.5) -9.58,-2.5 -9.58,-3.5 ccw(c-9.48,-3.5) -9.48,-3.6 -8.13,-3.6 ccw(c-8.13,-3.5) -8.03,-3.5 -8.03,-2.5 ; -8.98,-2.1 -9.38,-2.1 -9.38,-2 -9.38,2 -9.38,2.1 -8.98,2.1 ; -8.98,2.391 -9.03,2.4 -9.48,2.4 cw(c-9.48,2.5) -9.58,2.5 -9.58,3.5 cw(c-9.48,3.5) -9.48,3.6 -8.13,3.6 cw(c-8.13,3.5) -8.03,3.5 -8.03,2.5 ; -5.39,2.5 -5.39,3.6 -4.77,3.6 -4.77,2.5 ; -4.5,2.05 -4.5,1.55 ; -3.3,2.05 -3.3,1.55 ; -2.85,2.5 -2.85,3.6 -2.23,3.6 -2.23,2.5 ; -0.9,-2.05 -0.9,-1.55 ; -0.31,2.5 -0.31,3.6 0.31,3.6 0.31,2.5 ; 0.3,-2.05 0.3,-1.55 ; 0.3,2.05 0.3,1.55 ; 1.5,2.05 1.5,1.55 ; 2.23,2.5 2.23,3.6 2.85,3.6 2.85,2.5 ; 3.9,-2.05 3.9,-1.55 ; 4.77,2.5 4.77,3.6 5.39,3.6 5.39,2.5 ; 5.1,-2.05 5.1,-1.55 ; 8.03,-2.5 8.03,-3.5 ccw(c8.13,-3.5) 8.13,-3.6 9.48,-3.6 ccw(c9.48,-3.5) 9.58,-3.5 9.58,-2.5 ccw(c9.48,-2.5) 9.48,-2.4 9.03,-2.4 8.98,-2.391 ; 8.03,2.5 8.03,3.5 cw(c8.13,3.5) 8.13,3.6 9.48,3.6 cw(c9.48,3.5) 9.58,3.5 9.58,2.5 cw(c9.48,2.5) 9.48,2.4 9.03,2.4 8.98,2.391 ; 8.98,-2.109 9.03,-2.1 ; 8.98,-2.1 9.38,-2.1 9.38,-2 9.38,2 9.38,2.1 8.98,2.1 ; 8.98,2.109 9.03,2.1 ; 9.38,-1.6 9.58,-1.485 9.58,-1.45 9.58,1.45 9.58,1.485 9.38,1.6 ; -8.73,-2.5 -8.73,2.5 ; -8.73,-2.5 8.73,-2.5 ; -8.73,-2.5 -8.98,-2.5 -8.98,2.5 -8.73,2.5 ; -8.73,2.5 8.73,2.5 ; -8.23,-2.05 -6.61,-2.05 ; -8.23,-2.05 -8.23,2.05 ; -8.23,-2.05 -7.73,-1.55 ; -8.23,2.05 -6.61,2.05 ; -8.23,2.05 -7.73,1.55 ; -7.73,-1.55 -7.73,1.55 ; -7.73,-1.55 -6.61,-1.55 ; -7.73,-1.55 -7.48,-1.3 ; -7.73,1.55 -6.61,1.55 ; -7.73,1.55 -7.48,1.3 ; -7.48,-1.3 -7.48,1.3 ; -7.48,-1.3 7.48,-1.3 ; -7.48,1.3 7.48,1.3 ; -6.61,-2.05 6.61,-2.05 ; -6.61,-2.05 -6.61,-1.55 ; -6.61,-1.55 -0.9,-1.55 ; -6.61,1.55 -6.61,2.05 ; -6.61,1.55 -4.5,1.55 ; -6.61,2.05 6.61,2.05 ; -4.5,1.55 -3.3,1.55 ; -3.3,1.55 0.3,1.55 ; -0.9,-1.55 0.3,-1.55 ; 0.3,-1.55 3.9,-1.55 ; 0.3,1.55 1.5,1.55 ; 1.5,1.55 6.61,1.55 ; 3.9,-1.55 5.1,-1.55 ; 5.1,-1.55 6.61,-1.55 ; 6.61,-2.05 8.23,-2.05 ; 6.61,-2.05 6.61,-1.55 ; 6.61,-1.55 7.73,-1.55 ; 6.61,1.55 7.73,1.55 ; 6.61,1.55 6.61,2.05 ; 6.61,2.05 8.23,2.05 ; 7.48,-1.3 7.48,1.3 ; 7.48,-1.3 7.73,-1.55 ; 7.48,1.3 7.73,1.55 ; 7.73,-1.55 7.73,1.55 ; 7.73,-1.55 8.23,-2.05 ; 7.73,1.55 8.23,2.05 ; 8.23,-2.05 8.23,2.05 ; 8.73,-2.5 8.73,2.5 ; 8.73,-2.5 8.98,-2.5 8.98,2.5 8.73,2.5 ; -5.39,-0.76 -5.39,1.16 -4.77,1.16 -4.77,-0.76 -5.39,-0.76 ; -2.85,-0.76 -2.85,1.16 -2.23,1.16 -2.23,-0.76 -2.85,-0.76 ; -0.31,-0.76 0.31,-0.76 0.31,1.16 -0.31,1.16 -0.31,-0.76 ; 2.23,-0.76 2.23,1.16 2.85,1.16 2.85,-0.76 2.23,-0.76 ; 4.77,-0.76 4.77,1.16 5.39,1.16 5.39,-0.76 4.77,-0.76
3D body "254831.STEP": height 9.42, standoff -0.73, extent -9.58,-3.6 9.58,3.6

## MAXB6MPCBH [mm] "MaxiBridge 6 pin MALE HORIZONTAL"
height 5.05
pads (12):
  rect 1.02x3.2 smd: 1(6.35,-5.9) 2(3.81,-5.9) 3(1.27,-5.9) 4(-1.27,-5.9) 5(-3.81,-5.9) 6(-6.35,-5.9)
  rect 0x0 hole 1.6 unplated: MH1(-9.5,0) MH2(9.5,0)
  rect 1.95x2.7 smd: MP1(-10.075,2.45) MP2(-10.075,-2.45) MP3(10.075,2.45) MP4(10.075,-2.45)
Mechanical 13:
  lines w0.102: -10.27,-4.2 -10.27,4.7 10.27,4.7 10.27,-4.2 -10.27,-4.2
3D body "254707.STEP": height 6.12, standoff -1.08, extent -10.85,-5.45 10.85,4.7